# Altium footprint library Generic Footprint.PcbLib: 160 footprints (part 11 of 20)
Each footprint in its own frame and in the unit in brackets; x right, y up, seen from the top. Pads: shape width x height; smd on the part's side, far side on the other; paste and mask are expansions set on the pad; w line width, h text height; cw(c..) or ccw(c..) is an arc to the next point about the centre after c.
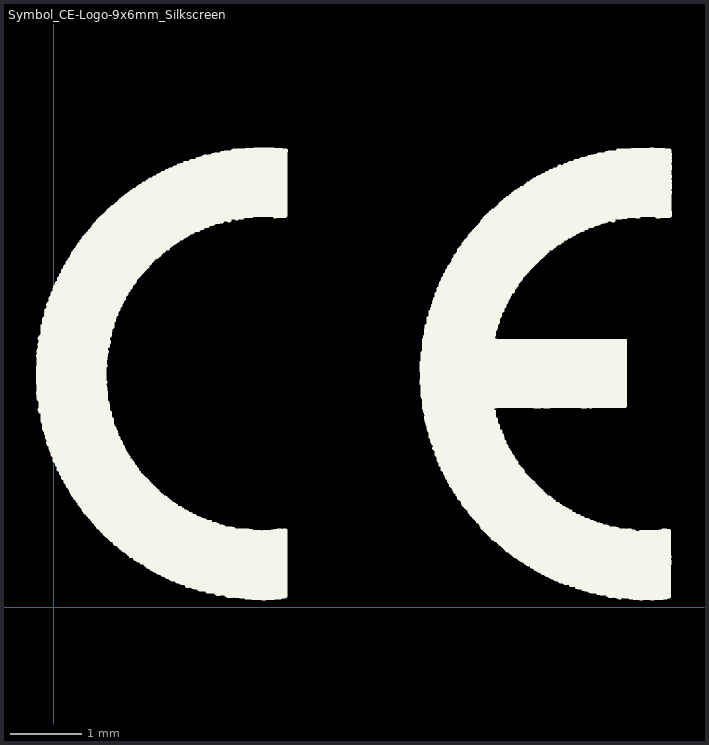
[diagram p10: the footprint, top view; thin cyan lines are the x and y axes]

## Symbol_CE-Logo-9x6mm_Silkscreen [mil]
pads (3108):
  round 2.36 on Top Overlay: 1(-8.64,118.11) 1(-8.64,123.42) 1(-8.64,123.77) 1(-8.64,124.13) 1(-8.64,124.49) 1(-8.64,124.84) 1(-8.64,125.19) 1(-8.64,125.55) 1(-8.64,126.61) 1(-8.64,126.96) 1(-8.64,127.32) 1(-8.64,127.67) 1(-8.64,128.03) 1(-8.64,128.38) 1(-8.64,128.74) 1(-8.64,129.09) 1(-8.64,129.44) 1(-8.64,129.8) 1(-8.64,130.15) 1(-8.64,130.51) 1(-8.64,130.86) 1(-8.64,131.22) 1(-8.64,131.57) 1(-8.64,131.93) 1(-8.64,132.28) 1(-8.64,138.66) 1(-8.29,115.27) 1(-8.29,115.63) 1(-8.29,115.98) 1(-8.29,116.33) 1(-8.29,116.69) 1(-8.29,118.46) 1(-8.29,118.82) 1(-8.29,119.17) 1(-8.29,119.52) 1(-8.29,119.88) 1(-8.29,120.23) 1(-8.29,120.59) 1(-8.29,120.94) 1(-8.29,121.3) 1(-8.29,121.65) 1(-8.29,122) 1(-8.29,122.36) 1(-8.29,122.71) 1(-8.29,123.07) 1(-8.29,125.9) 1(-8.29,126.26) 1(-8.29,132.63) 1(-8.29,132.99) 1(-8.29,133.34) 1(-8.29,133.7) 1(-8.29,134.05) 1(-8.29,134.41) 1(-8.29,134.76) 1(-8.29,135.11) 1(-8.29,135.47) 1(-8.29,135.82) 1(-8.29,136.18) 1(-8.29,136.53) 1(-8.29,136.88) 1(-8.29,137.24) 1(-8.29,137.6) 1(-8.29,137.95) 1(-8.29,138.3) 1(-8.29,140.78) 1(-8.29,141.14) 1(-7.94,114.56) 1(-7.94,114.92) 1(-7.94,117.04) 1(-7.94,117.4) 1(-7.94,117.75) 1(-7.94,139.01) 1(-7.94,139.37) 1(-7.94,139.72) 1(-7.94,140.07) 1(-7.94,140.43) 1(-7.94,141.49) 1(-7.94,141.85) 1(-7.94,142.2) 1(-7.58,108.89) 1(-7.58,142.55) 1(-7.58,144.33) 1(-7.58,144.68) 1(-7.58,145.04) 1(-7.58,148.22) 1(-7.23,107.83) 1(-7.23,108.18) 1(-7.23,108.54) 1(-7.23,109.96) 1(-7.23,110.31) 1(-7.23,110.66) 1(-7.23,111.02) 1(-7.23,111.37) 1(-7.23,111.73) 1(-7.23,112.08) 1(-7.23,112.44) 1(-7.23,112.79) 1(-7.23,113.15) 1(-7.23,113.5) 1(-7.23,113.85) 1(-7.23,114.21) 1(-7.23,142.91) 1(-7.23,143.26) 1(-7.23,143.62) 1(-7.23,143.97) 1(-7.23,145.39) 1(-7.23,145.74) 1(-7.23,146.1) 1(-7.23,146.45) 1(-7.23,146.81) 1(-6.87,109.25) 1(-6.87,109.6) 1(-6.87,147.16) 1(-6.87,147.52) 1(-6.87,147.87) 1(-6.87,148.58) 1(-6.87,148.93) 1(-6.87,149.29) 1(-6.17,102.87) 1(-6.17,103.22) 1(-6.17,103.58) 1(-6.17,103.93) 1(-6.17,104.29) 1(-6.17,104.64) 1(-6.17,104.99) 1(-6.17,105.35) 1(-6.17,105.71) 1(-6.17,106.06) 1(-6.17,106.41) 1(-6.17,106.77) 1(-6.17,107.48) 1(-6.17,149.64) 1(-6.17,149.99) 1(-6.17,150.35) 1(-6.17,150.71) 1(-6.17,151.06) 1(-6.17,151.41) 1(-6.17,151.77) 1(-6.17,152.12) 1(-6.17,152.48) 1(-6.17,152.83) 1(-6.17,153.18) 1(-6.17,153.54) 1(-6.17,154.96) 1(-5.81,102.16) 1(-5.81,102.52) 1(-5.81,107.12) 1(-5.81,153.89) 1(-5.81,154.25) 1(-5.81,154.6) 1(-5.1,98.26) 1(-5.1,98.97) 1(-5.1,99.33) 1(-5.1,99.68) 1(-5.1,100.04) 1(-5.1,100.39) 1(-5.1,100.74) 1(-5.1,101.1) 1(-5.1,101.45) 1(-5.1,101.81) 1(-5.1,155.31) 1(-5.1,155.66) 1(-5.1,156.02) 1(-5.1,156.37) 1(-5.1,156.73) 1(-5.1,157.08) 1(-5.1,157.44) 1(-5.1,157.79) 1(-5.1,158.15) 1(-5.1,158.85) 1(-4.75,97.55) 1(-4.75,97.91) 1(-4.75,98.62) 1(-4.75,158.5) 1(-4.75,159.21) 1(-4.39,159.56) 1(-4.04,95.78) 1(-4.04,96.14) 1(-4.04,96.49) 1(-4.04,97.2) 1(-4.04,161.33) 1(-4.04,161.69) 1(-4.04,162.04) 1(-4.04,163.46) 1(-3.68,93.66) 1(-3.68,94.01) 1(-3.68,94.37) 1(-3.68,94.72) 1(-3.68,95.07) 1(-3.68,95.43) 1(-3.68,96.85) 1(-3.68,159.92) 1(-3.68,160.27) 1(-3.68,160.63) 1(-3.68,160.98) 1(-3.68,162.4) 1(-3.68,162.75) 1(-3.68,163.11) 1(-3.33,92.95) 1(-3.33,93.3) 1(-3.33,163.82) 1(-3.33,164.17) 1(-2.98,90.47) 1(-2.98,166.65) 1(-2.62,89.76) 1(-2.62,90.11) 1(-2.62,90.82) 1(-2.62,91.18) 1(-2.62,91.53) 1(-2.62,91.88) 1(-2.62,92.24) 1(-2.62,92.6) 1(-2.62,164.52) 1(-2.62,164.88) 1(-2.62,165.23) 1(-2.62,165.59) 1(-2.62,165.94) 1(-2.62,166.3) 1(-2.62,167.36) 1(-2.27,89.41) 1(-2.27,167) 1(-1.56,87.28) 1(-1.56,87.63) 1(-1.56,87.99) 1(-1.56,88.34) 1(-1.56,88.7) 1(-1.56,89.05) 1(-1.56,167.71) 1(-1.56,168.07) 1(-1.56,168.42) 1(-1.56,168.77) 1(-1.56,169.13) 1(-1.56,169.49) 1(-1.56,169.84) 1(-1.56,170.19) 1(-1.2,86.22) 1(-1.2,86.57) 1(-1.2,86.93) 1(-1.2,170.55) 1(-1.2,170.9) 1(-0.85,85.86) 1(-0.5,84.09) 1(-0.5,84.8) 1(-0.5,85.51) 1(-0.5,171.26) 1(-0.5,171.61) 1(-0.5,172.32) 1(-0.5,173.03) 1(-0.14,84.44) 1(-0.14,85.15) 1(-0.14,171.96) 1(-0.14,172.67) 1(0.21,83.74) 1(0.57,80.9) 1(0.57,81.26) 1(0.57,81.61) 1(0.57,81.96) 1(0.57,82.32) 1(0.57,82.67) 1(0.57,83.03) 1(0.57,83.38) 1(0.57,173.38) 1(0.57,173.74) 1(0.57,174.09) 1(0.57,174.44) 1(0.57,174.8) 1(0.57,175.15) 1(0.57,175.51) 1(0.92,80.55) 1(0.92,175.86) 1(0.92,176.57) 1(1.28,80.19) 1(1.28,176.22) 1(1.63,176.93) 1(1.63,177.99) 1(1.99,78.42) 1(1.99,78.77) 1(1.99,79.13) 1(1.99,79.49) 1(1.99,79.84) 1(1.99,177.28) 1(1.99,177.63) 1(1.99,178.34) 1(1.99,178.7) 1(2.34,78.07) 1(2.69,75.94) 1(2.69,179.05) 1(3.05,76.3) 1(3.05,76.65) 1(3.05,77) 1(3.05,77.36) 1(3.05,77.71) 1(3.05,179.41) 1(3.05,179.76) 1(3.05,180.11) 1(3.05,180.47) 1(3.05,180.82) 1(3.05,181.18) 1(3.76,75.59) 1(4.11,73.82) 1(4.11,74.17) 1(4.11,74.52) 1(4.11,74.88) 1(4.11,75.23) 1(4.11,181.53) 1(4.11,181.88) 1(4.11,182.24) 1(4.11,182.6) 1(4.11,182.95) 1(4.47,73.46) 1(4.47,183.3) 1(5.17,71.33) 1(5.17,71.69) 1(5.17,72.04) 1(5.17,72.4) 1(5.17,72.75) 1(5.17,73.11) 1(5.17,183.66) 1(5.17,184.01) 1(5.17,184.37) 1(5.17,184.72) 1(5.17,185.07) 1(5.17,185.43) 1(5.53,185.78) 1(5.88,70.98) 1(6.24,70.63) 1(6.24,186.14) 1(6.24,186.49) 1(6.24,187.2) 1(6.59,69.21) 1(6.59,69.56) 1(6.59,69.92) 1(6.59,70.27) 1(6.59,186.85) 1(6.59,187.55) 1(6.59,187.91) 1(6.94,68.85) 1(7.66,67.44) 1(7.66,67.79) 1(7.66,68.15) 1(7.66,68.5) 1(7.66,188.26) 1(7.66,188.62) 1(7.66,188.97) 1(7.66,189.33) 1(7.66,189.68) 1(7.66,190.04) 1(8.01,66.73) 1(8.01,67.08) 1(8.36,190.39) 1(8.72,66.02) 1(8.72,66.37) 1(8.72,190.74) 1(8.72,191.1) 1(8.72,191.45) 1(9.07,65.66) 1(9.78,63.89) 1(9.78,64.25) 1(9.78,64.6) 1(9.78,64.96) 1(9.78,65.31) 1(9.78,191.81) 1(9.78,192.16) 1(9.78,192.52) 1(10.13,63.18) 1(10.13,63.54) 1(10.13,192.87) 1(10.13,193.22) 1(10.13,193.58) 1(10.84,61.77) 1(10.84,62.12) 1(10.84,62.48) 1(10.84,62.83) 1(10.84,193.93) 1(10.84,194.29) 1(10.84,194.64) 1(10.84,194.99) 1(10.84,195.35) 1(11.2,61.41) 1(11.2,195.71) 1(11.55,61.06) 1(11.55,196.06) 1(11.91,60.35) 1(11.91,60.71) 1(11.91,196.06) 1(12.26,59.99) 1(12.26,196.06) 1(12.26,196.41) 1(12.26,196.77) 1(12.26,197.12) 1(12.97,197.48) 1(13.32,58.58) 1(13.32,58.93) 1(13.32,59.29) 1(13.32,59.64) 1(13.32,197.83) 1(13.32,198.18) 1(13.32,198.54) 1(13.68,198.89) 1(13.68,199.25) 1(14.39,56.81) 1(14.39,57.16) 1(14.39,57.52) 1(14.39,57.87) 1(14.39,58.22) 1(14.39,199.6) 1(14.39,199.96) 1(14.39,200.31) 1(14.74,56.45) 1(15.45,55.74) 1(15.45,56.1) 1(15.45,200.66) 1(15.45,201.02) 1(15.45,201.73) 1(15.8,55.39) 1(15.8,201.37) 1(16.51,53.97) 1(16.51,54.33) 1(16.51,54.68) 1(16.51,55.04) 1(16.51,202.08) 1(16.51,202.44) 1(16.51,202.79) 1(16.51,203.15) 1(16.87,53.26) 1(16.87,53.62) 1(16.87,203.5) 1(16.87,203.85) 1(17.58,52.2) 1(17.58,52.91) 1(17.58,204.21) 1(17.93,52.55) 1(17.93,204.56) 1(17.93,204.92) 1(18.28,51.85) 1(18.99,50.78) 1(18.99,51.14) 1(18.99,51.49) 1(18.99,205.27) 1(18.99,205.63) 1(18.99,205.98) 1(19.35,206.33) 1(20.05,49.72) 1(20.05,50.07) 1(20.05,50.43) 1(20.05,206.69) 1(20.05,207.04) 1(20.05,207.4) 1(21.12,48.66) 1(21.12,49.01) 1(21.12,49.37) 1(21.12,207.75) 1(21.12,208.11) 1(21.12,208.46) 1(21.83,48.3) 1(22.18,47.24) 1(22.18,47.6) 1(22.18,47.95) 1(22.18,208.82) 1(22.18,209.17) 1(22.18,209.52) 1(22.18,209.88) 1(22.54,210.23) 1(22.54,210.59) 1(22.89,47.24) 1(23.24,46.18) 1(23.24,47.24) 1(23.24,210.94) 1(23.6,45.47) 1(23.6,45.82) 1(23.6,46.53) 1(23.6,46.88) 1(23.6,211.3) 1(23.6,211.65) 1(23.95,45.11) 1(23.95,212) 1(24.66,44.05) 1(24.66,44.41) 1(24.66,44.76) 1(24.66,212.36) 1(24.66,212.71) 1(24.66,213.07) 1(25.37,43.7) 1(25.72,213.42) 1(25.72,213.77) 1(25.72,214.13) 1(26.08,42.99) 1(26.08,43.34) 1(26.43,42.63) 1(26.79,41.93) 1(26.79,42.28) 1(26.79,214.49) 1(26.79,214.84) 1(26.79,215.19) 1(27.5,41.57) 1(27.85,41.22) 1(27.85,122.36) 1(27.85,122.71) 1(27.85,123.07) 1(27.85,123.42) 1(27.85,124.84) 1(27.85,125.19) 1(27.85,125.55) 1(27.85,125.9) 1(27.85,126.26) 1(27.85,126.61) 1(27.85,126.96) 1(27.85,127.32) 1(27.85,127.67) 1(27.85,128.03) 1(27.85,128.38) 1(27.85,128.74) 1(27.85,129.09) 1(27.85,129.44) 1(27.85,129.8) 1(27.85,130.15) 1(27.85,130.51) 1(27.85,130.86) 1(27.85,131.22) 1(27.85,131.57) 1(27.85,131.93) 1(27.85,132.28) 1(27.85,133.7) 1(27.85,134.05) 1(27.85,134.41) 1(27.85,134.76) 1(27.85,215.55) 1(27.85,215.9) 1(28.21,40.51) 1(28.21,40.86) 1(28.21,120.94) 1(28.21,121.3) 1(28.21,121.65) 1(28.21,122) 1(28.21,123.77) 1(28.21,124.49) 1(28.21,132.63) 1(28.21,135.11) 1(28.21,135.47) 1(28.21,135.82) 1(28.21,136.18) 1(28.21,136.53) 1(28.21,216.26) 1(28.56,117.4) 1(28.56,117.75) 1(28.56,118.11) 1(28.56,118.82) 1(28.56,119.17) 1(28.56,119.52) 1(28.56,119.88) 1(28.56,120.23) 1(28.56,120.59) 1(28.56,124.13) 1(28.56,132.99) 1(28.56,133.34) 1(28.56,136.88) 1(28.56,137.24) 1(28.56,137.6) 1(28.56,137.95) 1(28.56,138.3) 1(28.56,138.66) 1(28.56,139.37) 1(28.56,139.72) 1(28.56,140.07) 1(28.56,140.43) 1(28.56,141.85) 1(28.56,143.62) 1(28.91,113.15) 1(28.91,113.5) 1(28.91,113.85) 1(28.91,114.21) 1(28.91,114.56) 1(28.91,114.92) 1(28.91,115.27) 1(28.91,115.63) 1(28.91,115.98) 1(28.91,116.33) 1(28.91,116.69) 1(28.91,117.04) 1(28.91,118.46) 1(28.91,139.01) 1(28.91,141.14) 1(28.91,141.49) 1(28.91,142.2) 1(28.91,142.55) 1(28.91,142.91) 1(28.91,143.26) 1(28.91,216.61) 1(29.27,39.44) 1(29.27,39.8) 1(29.27,40.15) 1(29.27,140.78) 1(29.27,143.97) 1(29.27,216.96) 1(29.27,217.32) 1(29.62,110.66) 1(29.62,111.73) 1(29.62,112.08) 1(29.62,112.44) 1(29.62,112.79) 1(29.62,143.97) 1(29.62,144.33) 1(29.62,144.68) 1(29.62,145.04) 1(29.62,217.67) 1(29.98,107.48) 1(29.98,107.83) 1(29.98,108.18) 1(29.98,108.54) 1(29.98,108.89) 1(29.98,109.25) 1(29.98,109.6) 1(29.98,109.96) 1(29.98,110.31) 1(29.98,111.02) 1(29.98,111.37) 1(29.98,143.97) 1(29.98,145.39) 1(29.98,146.81) 1(29.98,147.16) 1(29.98,147.52) 1(29.98,147.87) 1(29.98,148.22) 1(29.98,148.58) 1(29.98,148.93) 1(29.98,149.29) 1(30.33,38.74) 1(30.33,39.09) 1(30.33,145.74) 1(30.33,146.1) 1(30.33,146.45) 1(30.33,149.64) 1(30.33,218.03) 1(30.33,218.38) 1(30.33,218.74) 1(30.69,38.38) 1(30.69,106.77) 1(30.69,150.71) 1(31.04,38.03) 1(31.04,103.93) 1(31.04,104.29) 1(31.04,104.64) 1(31.04,104.99) 1(31.04,105.35) 1(31.04,105.71) 1(31.04,106.06) 1(31.04,106.41) 1(31.04,107.12) 1(31.04,149.99) 1(31.04,150.35) 1(31.04,151.06) 1(31.04,151.41) 1(31.04,151.77) 1(31.04,152.12) 1(31.04,152.48) 1(31.04,153.89) 1(31.39,37.67) 1(31.39,152.83) 1(31.39,153.18) 1(31.39,153.54) 1(31.39,219.09) 1(31.39,219.44) 1(31.75,37.32) 1(31.75,102.87) 1(31.75,103.22) 1(31.75,154.25) 1(31.75,219.8) 1(32.1,36.96) 1(32.1,99.68) 1(32.1,100.39) 1(32.1,100.74) 1(32.1,101.1) 1(32.1,101.45) 1(32.1,101.81) 1(32.1,102.16) 1(32.1,102.52) 1(32.1,103.58) 1(32.1,154.96) 1(32.1,156.02) 1(32.1,156.37) 1(32.1,156.73) 1(32.46,99.33) 1(32.46,100.04) 1(32.46,154.6) 1(32.46,155.31) 1(32.46,155.66) 1(32.46,157.08) 1(32.46,157.44) 1(32.46,220.15) 1(32.46,220.51) 1(32.81,157.79) 1(33.17,97.55) 1(33.17,98.62) 1(33.17,98.97) 1(33.17,158.15) 1(33.17,158.5) 1(33.17,158.85) 1(33.17,159.21) 1(33.17,159.92) 1(33.17,160.63) 1(33.17,220.86) 1(33.52,35.9) 1(33.52,97.2) 1(33.52,97.91) 1(33.52,98.26) 1(33.52,159.56) 1(33.52,160.27) 1(33.52,160.98) 1(33.88,35.19) 1(33.88,35.55) 1(33.88,36.26) 1(33.88,36.61) 1(34.23,34.84) 1(34.23,94.01) 1(34.23,94.72) 1(34.23,95.78) 1(34.23,96.14) 1(34.23,96.49) 1(34.23,96.85) 1(34.23,161.69) 1(34.23,162.75) 1(34.58,93.66) 1(34.58,94.37) 1(34.58,95.07) 1(34.58,95.43) 1(34.58,161.33) 1(34.58,162.04) 1(34.58,162.4) 1(34.58,163.11) 1(34.58,221.22) 1(34.58,221.93) 1(34.94,163.46) 1(34.94,221.57) 1(34.94,222.28) 1(35.29,163.82) 1(35.65,91.53) 1(35.65,91.88) 1(35.65,92.24) 1(35.65,92.6) 1(35.65,92.95) 1(35.65,93.3) 1(35.65,164.17) 1(35.65,164.52) 1(35.65,164.88) 1(35.65,165.23) 1(36,33.77) 1(36,34.13) 1(36,34.49) 1(36,165.59) 1(36,222.63) 1(36,222.99) 1(36,223.34) 1(36.36,165.94) 1(36.71,89.41) 1(36.71,89.76) 1(36.71,90.11) 1(36.71,90.82) 1(36.71,91.18) 1(36.71,166.3) 1(36.71,166.65) 1(36.71,167) 1(36.71,167.36) 1(37.06,32.71) 1(37.06,33.07) 1(37.06,33.42) 1(37.06,89.05) 1(37.06,90.47) 1(37.06,167.71) 1(37.06,223.7) 1(37.06,224.05) 1(37.06,224.41) 1(37.42,168.07) 1(37.77,32.36) 1(37.77,88.7) 1(37.77,168.42) 1(37.77,168.77) 1(37.77,169.13) 1(38.13,32) 1(38.13,86.93) 1(38.13,87.28) 1(38.13,87.63) 1(38.13,87.99) 1(38.13,88.34) 1(38.13,169.49) 1(38.13,169.84) 1(38.13,224.76) 1(38.48,31.65) 1(38.48,225.11) 1(38.48,225.47) 1(38.83,31.3) 1(38.83,85.15) 1(38.83,85.86) 1(38.83,86.22) 1(38.83,86.57) 1(38.83,170.19) 1(38.83,170.55) 1(38.83,170.9) 1(38.83,171.26) 1(38.83,171.61) 1(39.19,31.3) 1(39.19,84.8) 1(39.19,85.51) 1(39.19,171.96) 1(39.19,172.32) 1(39.19,225.82) 1(39.55,31.3) 1(39.55,226.18) 1(39.9,31.3) 1(39.9,83.74) 1(39.9,84.44) 1(39.9,172.67) 1(39.9,226.53) 1(40.25,31.3) 1(40.25,83.38) 1(40.25,84.09) 1(40.25,173.03) 1(40.25,173.38) 1(40.25,173.74) 1(40.25,174.09) 1(40.25,174.44) 1(40.25,226.88) 1(40.61,30.23) 1(40.61,30.59) 1(40.61,30.94) 1(40.61,226.88) 1(40.96,30.23) 1(40.96,83.03) 1(41.32,30.23) 1(41.32,81.26) 1(41.32,81.61) 1(41.32,81.96) 1(41.32,82.32) 1(41.32,82.67) 1(41.32,174.8) 1(41.32,175.15) 1(41.32,175.51) 1(41.67,29.17) 1(41.67,29.52) 1(41.67,29.88) 1(41.67,175.86) 1(41.67,226.88) 1(41.67,227.24) 1(41.67,227.6) 1(41.67,227.95) 1(42.38,80.55) 1(42.38,80.9) 1(42.38,176.22) 1(42.38,176.57) 1(42.73,28.11) 1(42.73,28.46) 1(42.73,28.82) 1(42.73,80.19) 1(42.73,176.93) 1(42.73,177.28) 1(42.73,177.63) 1(42.73,177.99) 1(42.73,228.3) 1(42.73,228.66) 1(43.09,79.84) 1(43.09,229.01) 1(43.44,78.42) 1(43.44,79.13) 1(43.44,79.49) 1(43.44,178.34) 1(43.8,77.71) 1(43.8,78.07) 1(43.8,78.77) 1(43.8,178.7) 1(43.8,179.05) 1(43.8,179.41) 1(44.15,179.41) 1(44.15,229.37) 1(44.15,229.72) 1(44.5,179.41) 1(44.5,179.76) 1(44.5,180.47) 1(44.5,181.18) 1(44.5,230.07) 1(44.86,27.04) 1(44.86,27.75) 1(44.86,76.65) 1(44.86,77) 1(44.86,77.36) 1(44.86,180.11) 1(44.86,180.82) 1(44.86,181.53) 1(45.21,26.69) 1(45.21,27.4) 1(45.57,76.3) 1(45.92,74.52) 1(45.92,74.88) 1(45.92,75.23) 1(45.92,75.59) 1(45.92,75.94) 1(45.92,181.88) 1(45.92,182.24) 1(46.28,25.98) 1(46.28,26.33) 1(46.28,74.17) 1(46.28,182.6) 1(46.28,230.43) 1(46.28,230.78) 1(46.28,231.14) 1(46.63,74.17) 1(46.63,231.49) 1(46.99,25.63) 1(46.99,73.46) 1(46.99,73.82) 1(46.99,74.17) 1(46.99,182.95) 1(46.99,183.3) 1(46.99,183.66) 1(46.99,231.49) 1(47.34,73.11) 1(47.34,231.49) 1(47.34,231.85) 1(47.69,184.01) 1(47.69,232.2) 1(48.05,72.75) 1(48.05,184.37) 1(48.4,24.92) 1(48.4,25.27) 1(48.4,72.04) 1(48.4,72.4) 1(48.4,184.72) 1(48.76,24.56) 1(48.76,185.07) 1(49.11,71.69) 1(49.11,185.43) 1(49.47,70.98) 1(49.47,71.33) 1(49.47,185.78) 1(49.47,186.14) 1(49.47,233.26) 1(49.82,232.55) 1(49.82,232.91) 1(49.82,233.62) 1(50.17,186.49) 1(50.53,69.92) 1(50.53,70.27) 1(50.53,70.63) 1(50.53,186.85) 1(50.53,187.2) 1(50.88,23.5) 1(50.88,23.85) 1(50.88,24.21) 1(51.24,187.55) 1(51.59,68.5) 1(51.59,68.85) 1(51.59,69.21) 1(51.59,69.56) 1(51.59,187.91) 1(51.59,188.26) 1(51.59,188.62) 1(51.59,188.97) 1(51.59,189.33) 1(51.94,22.44) 1(51.94,22.79) 1(51.94,23.15) 1(51.94,189.68) 1(51.94,233.97) 1(51.94,234.33) 1(51.94,234.68) 1(52.3,189.68) 1(52.66,22.08) 1(52.66,67.44) 1(52.66,68.15) 1(52.66,190.04) 1(52.66,190.39) 1(53.01,67.79) 1(53.01,189.68) 1(53.01,190.74) 1(53.01,235.04) 1(53.01,235.39) 1(53.36,22.08) 1(53.36,190.74) 1(53.36,235.74) 1(53.72,66.73) 1(53.72,67.08) 1(53.72,190.74) 1(53.72,191.45) 1(54.07,21.02) 1(54.07,21.37) 1(54.07,22.08) 1(54.07,66.37) 1(54.07,191.1) 1(54.07,191.81) 1(54.43,21.73) 1(54.78,66.02) 1(54.78,192.52) 1(55.13,65.66) 1(55.13,192.16) 1(55.13,192.87) 1(55.49,20.31) 1(55.49,20.66) 1(55.49,65.31) 1(55.49,236.1) 1(55.49,236.45) 1(55.49,236.81) 1(55.84,64.96) 1(56.2,64.25) 1(56.2,64.6) 1(56.55,19.96) 1(56.91,193.22) 1(57.26,63.18) 1(57.26,63.54) 1(57.26,63.89) 1(57.26,193.58) 1(57.26,193.93) 1(57.61,19.25) 1(57.61,19.6) 1(57.61,62.83) 1(57.61,237.16) 1(57.61,237.52) 1(57.61,237.87) 1(58.32,18.89) 1(58.32,61.77) 1(58.32,62.12) 1(58.32,62.48) 1(58.32,194.29) 1(58.32,194.64) 1(58.32,194.99) 1(58.32,238.22) 1(58.68,195.35) 1(59.39,61.06) 1(59.39,195.71) 1(59.39,196.06) 1(59.39,238.22) 1(59.74,18.54) 1(59.74,60.71) 1(59.74,61.41) 1(59.74,238.22) 1(59.74,238.58) 1(59.74,238.93) 1(60.1,18.18) 1(60.1,239.29) 1(60.45,17.83) 1(60.45,196.41) 1(60.45,197.12) 1(60.8,196.77) 1(60.8,197.48) 1(61.51,60.35) 1(61.87,17.48) 1(61.87,59.64) 1(61.87,59.99) 1(62.22,17.12) 1(62.22,239.64) 1(62.22,239.99) 1(62.22,240.35) 1(62.58,16.77) 1(62.58,59.29) 1(62.93,58.58) 1(62.93,58.93) 1(62.93,197.83) 1(62.93,198.18) 1(62.93,198.54) 1(63.28,58.22) 1(63.64,58.22) 1(63.64,198.89) 1(63.99,16.41) 1(63.99,57.52) 1(63.99,58.22) 1(63.99,199.25) 1(63.99,199.6) 1(64.35,16.06) 1(64.35,57.16) 1(64.35,57.87) 1(64.35,240.71) 1(64.35,241.06) 1(64.35,241.41) 1(64.7,15.71) 1(65.05,199.96) 1(65.05,200.31) 1(65.41,15.35) 1(65.41,200.66) 1(65.77,15.35) 1(65.77,201.02) 1(66.12,15.35) 1(66.12,56.81) 1(66.12,201.02) 1(66.47,56.45) 1(66.47,201.02) 1(66.47,241.77) 1(66.47,242.12) 1(66.83,56.1) 1(67.18,201.37) 1(67.18,242.48) 1(67.54,55.04) 1(67.54,55.39) 1(67.54,55.74) 1(67.54,201.73) 1(67.54,202.08) 1(67.89,14.64) 1(67.89,14.99) 1(67.89,202.08) 1(68.24,14.29) 1(68.24,202.08) 1(68.6,202.44) 1(68.6,202.79) 1(68.95,54.68) 1(68.95,203.15) 1(68.95,242.83) 1(68.95,243.18) 1(68.95,243.54) 1(69.31,54.68) 1(69.66,53.97) 1(69.66,54.33) 1(69.66,54.68) 1(70.02,13.58) 1(70.02,13.93) 1(70.37,243.89) 1(70.72,52.91) 1(70.72,203.5) 1(71.08,13.22) 1(71.08,52.55) 1(71.08,53.26) 1(71.08,53.62) 1(71.08,203.85) 1(71.08,204.21) 1(71.08,243.89) 1(71.43,243.89) 1(72.14,204.56) 1(72.14,244.25) 1(72.5,52.55) 1(72.5,244.6) 1(72.5,244.96) 1(72.85,52.55) 1(72.85,244.96) 1(73.21,12.87) 1(73.21,51.49) 1(73.21,51.85) 1(73.21,204.92) 1(73.21,205.27) 1(73.21,244.96) 1(73.56,11.81) 1(73.56,12.16) 1(73.56,12.52) 1(73.56,52.2) 1(73.91,205.63) 1(74.27,11.81) 1(74.27,205.98) 1(74.27,206.33) 1(74.62,206.69) 1(74.98,206.69) 1(75.69,11.81) 1(75.69,50.43) 1(75.69,50.78) 1(75.69,51.14) 1(75.69,245.31) 1(75.69,245.66) 1(76.04,11.81) 1(76.04,206.69) 1(76.04,246.02) 1(76.39,11.81) 1(76.39,207.4) 1(76.39,246.02) 1(76.75,207.04) 1(76.75,207.75) 1(76.75,246.02) 1(77.1,11.1) 1(77.1,11.45) 1(77.81,49.37) 1(77.81,49.72) 1(77.81,50.07) 1(78.17,10.74) 1(79.23,246.37) 1(79.23,246.73) 1(79.58,49.01) 1(79.58,247.08) 1(79.94,208.11) 1(79.94,208.46) 1(80.29,10.04) 1(80.29,10.39) 1(80.29,208.82) 1(80.65,48.66) 1(81,9.68) 1(81,48.3) 1(81.36,9.68) 1(81.36,247.44) 1(81.71,9.68) 1(81.71,247.44) 1(82.06,209.17) 1(82.06,209.52) 1(82.42,47.95) 1(82.42,209.88) 1(82.42,247.44) 1(82.42,247.79) 1(83.48,46.88) 1(83.48,47.24) 1(83.48,47.6) 1(83.48,248.15) 1(83.48,248.5) 1(83.83,248.5) 1(84.19,210.23) 1(84.55,46.88) 1(84.55,210.23) 1(84.55,210.59) 1(84.55,210.94) 1(84.9,8.62) 1(84.9,8.97) 1(84.9,9.33) 1(84.9,46.88) 1(84.9,210.23) 1(84.9,211.3) 1(85.25,211.3) 1(85.61,8.62) 1(85.61,248.5) 1(85.96,8.62) 1(85.96,46.88) 1(85.96,248.5) 1(86.32,46.53) 1(86.32,46.88) 1(86.67,45.82) 1(86.67,46.18) 1(87.02,211.3) 1(87.02,248.5) 1(87.38,248.85) 1(87.73,249.21) 1(88.09,211.65) 1(88.09,212) 1(88.44,212.36) 1(88.8,45.82) 1(88.8,212.36) 1(89.15,45.47) 1(89.15,45.82) 1(89.15,212.36) 1(89.15,249.56) 1(89.5,7.91) 1(89.5,8.26) 1(89.5,212.36) 1(90.21,212.36) 1(90.57,7.2) 1(90.57,7.55) 1(90.57,44.76) 1(90.57,45.11) 1(90.57,212.36) 1(90.92,7.2) 1(90.92,212.36) 1(91.99,212.71) 1(92.34,212.71) 1(92.69,44.41) 1(92.69,212.71) 1(92.69,213.07) 1(92.69,213.42) 1(92.69,250.27) 1(93.05,249.92) 1(93.76,43.7) 1(93.76,44.05) 1(94.47,250.63) 1(95.17,6.85) 1(95.17,7.2) 1(96.24,6.14) 1(96.24,6.49) 1(96.24,213.77) 1(96.59,6.14) 1(96.59,213.42) 1(96.59,213.77) 1(96.94,213.42) 1(96.94,213.77) 1(96.94,214.13) 1(97.3,214.49) 1(98.01,6.14) 1(98.01,43.34) 1(98.36,6.14) 1(98.72,250.98) 1(98.72,251.33) 1(99.07,42.99) 1(99.43,42.63) 1(99.43,251.69) 1(99.78,6.14) 1(99.78,42.28) 1(99.78,251.69) 1(100.13,42.28) 1(100.49,214.84) 1(100.84,6.14) 1(100.84,42.28) 1(100.84,214.49) 1(100.84,214.84) 1(101.2,214.49) 1(101.2,214.84) 1(101.2,251.69) 1(101.55,6.14) 1(101.55,42.28) 1(101.91,6.14) 1(102.26,6.14) 1(103.32,5.78) 1(103.32,42.28) 1(103.32,214.84) 1(103.68,42.28) 1(104.03,214.84) 1(104.03,215.19) 1(104.03,215.55) 1(104.39,42.28) 1(105.8,42.28) 1(106.16,5.43) 1(106.16,252.04) 1(106.87,41.93) 1(106.87,42.28) 1(107.22,215.9) 1(107.58,215.9) 1(107.58,252.04) 1(108.28,41.93) 1(108.64,41.93) 1(108.64,215.9) 1(108.99,215.9) 1(108.99,252.04) 1(109.35,215.9) 1(109.7,5.07) 1(109.7,41.57) 1(109.7,252.04) 1(110.05,41.22) 1(111.12,41.22) 1(111.12,252.04) 1(111.12,252.4) 1(112.18,41.22) 1(112.89,41.22) 1(114.31,41.22) 1(114.66,5.07) 1(115.02,5.07) 1(115.37,4.72) 1(115.72,4.72) 1(115.72,41.22) 1(116.08,4.72) 1(116.43,4.72) 1(118.91,41.22) 1(120.33,5.07) 1(120.33,41.22) 1(120.33,41.57) 1(120.69,5.07) 1(121.04,5.07) 1(121.04,252.4) 1(121.39,252.04) 1(122.1,41.93) 1(122.1,215.55) 1(122.1,215.9) 1(122.46,41.93) 1(122.46,215.55) 1(122.46,252.04) 1(122.81,215.9) 1(123.17,215.9) 1(123.52,252.04) 1(123.88,41.93) 1(123.88,42.28) 1(124.58,252.04) 1(124.94,5.43) 1(124.94,42.28) 1(125.65,252.04) 1(127.06,5.78) 1(127.06,42.28) 1(127.77,6.14) 1(127.77,6.49) 1(127.77,6.85) 1(127.77,7.2) 1(127.77,7.55) 1(127.77,7.91) 1(127.77,8.26) 1(127.77,8.62) 1(127.77,8.97) 1(127.77,9.33) 1(127.77,9.68) 1(127.77,10.04) 1(127.77,10.39) 1(127.77,10.74) 1(127.77,11.1) 1(127.77,11.45) 1(127.77,11.81) 1(127.77,12.16) 1(127.77,12.52) 1(127.77,12.87) 1(127.77,13.22) 1(127.77,13.58) 1(127.77,13.93) 1(127.77,14.29) 1(127.77,14.64) 1(127.77,14.99) 1(127.77,15.35) 1(127.77,15.71) 1(127.77,16.06) 1(127.77,16.41) 1(127.77,16.77) 1(127.77,17.12) 1(127.77,17.48) 1(127.77,17.83) 1(127.77,18.18) 1(127.77,18.54) 1(127.77,18.89) 1(127.77,19.25) 1(127.77,19.6) 1(127.77,19.96) 1(127.77,20.31) 1(127.77,20.66) 1(127.77,21.02) 1(127.77,21.37) 1(127.77,21.73) 1(127.77,22.08) 1(127.77,22.44) 1(127.77,22.79) 1(127.77,23.15) 1(127.77,23.5) 1(127.77,23.85) 1(127.77,24.21) 1(127.77,24.56) 1(127.77,24.92) 1(127.77,25.27) 1(127.77,25.63) 1(127.77,25.98) 1(127.77,26.33) 1(127.77,26.69) 1(127.77,27.04) 1(127.77,27.4) 1(127.77,27.75) 1(127.77,28.11) 1(127.77,28.46) 1(127.77,28.82) 1(127.77,29.17) 1(127.77,29.52) 1(127.77,29.88) 1(127.77,30.23) 1(127.77,30.59) 1(127.77,30.94) 1(127.77,31.3) 1(127.77,31.65) 1(127.77,32) 1(127.77,32.36) 1(127.77,32.71) 1(127.77,33.07) 1(127.77,33.42) 1(127.77,33.77) 1(127.77,34.13) 1(127.77,34.49) 1(127.77,34.84) 1(127.77,35.19) 1(127.77,35.55) 1(127.77,35.9) 1(127.77,36.26) 1(127.77,36.61) 1(127.77,36.96) 1(127.77,37.32) 1(127.77,37.67) 1(127.77,38.03) 1(127.77,38.38) 1(127.77,38.74) 1(127.77,39.09) 1(127.77,39.44) 1(127.77,39.8) 1(127.77,40.15) 1(127.77,40.51) 1(127.77,40.86) 1(127.77,41.22) 1(127.77,41.57) 1(127.77,41.93) 1(127.77,42.28) 1(127.77,215.9) 1(127.77,216.26) 1(127.77,216.61) 1(127.77,216.96) 1(127.77,217.32) 1(127.77,217.67) 1(127.77,218.03) 1(127.77,218.38) 1(127.77,218.74) 1(127.77,219.09) 1(127.77,219.44) 1(127.77,219.8) 1(127.77,220.15) 1(127.77,220.51) 1(127.77,220.86) 1(127.77,221.22) 1(127.77,221.57) 1(127.77,221.93) 1(127.77,222.28) 1(127.77,222.63) 1(127.77,222.99) 1(127.77,223.34) 1(127.77,223.7) 1(127.77,224.05) 1(127.77,224.41) 1(127.77,224.76) 1(127.77,225.11) 1(127.77,225.47) 1(127.77,225.82) 1(127.77,226.18) 1(127.77,226.53) 1(127.77,226.88) 1(127.77,227.24) 1(127.77,227.6) 1(127.77,227.95) 1(127.77,228.3) 1(127.77,228.66) 1(127.77,229.01) 1(127.77,229.37) 1(127.77,229.72) 1(127.77,230.07) 1(127.77,230.43) 1(127.77,230.78) 1(127.77,231.14) 1(127.77,231.49) 1(127.77,231.85) 1(127.77,232.2) 1(127.77,232.55) 1(127.77,232.91) 1(127.77,233.26) 1(127.77,233.62) 1(127.77,233.97) 1(127.77,234.33) 1(127.77,234.68) 1(127.77,235.04) 1(127.77,235.39) 1(127.77,235.74) 1(127.77,236.1) 1(127.77,236.45) 1(127.77,236.81) 1(127.77,237.16) 1(127.77,237.52) 1(127.77,237.87) 1(127.77,238.22) 1(127.77,238.58) 1(127.77,238.93) 1(127.77,239.29) 1(127.77,239.64) 1(127.77,239.99) 1(127.77,240.35) 1(127.77,240.71) 1(127.77,241.06) 1(127.77,241.41) 1(127.77,241.77) 1(127.77,242.12) 1(127.77,242.48) 1(127.77,242.83) 1(127.77,243.18) 1(127.77,243.54) 1(127.77,243.89) 1(127.77,244.25) 1(127.77,244.6) 1(127.77,244.96) 1(127.77,245.31) 1(127.77,245.66) 1(127.77,246.02) 1(127.77,246.37) 1(127.77,246.73) 1(127.77,247.08) 1(127.77,247.44) 1(127.77,247.79) 1(127.77,248.15) 1(127.77,248.5) 1(127.77,248.85) 1(127.77,249.21) 1(127.77,249.56) 1(127.77,249.92) 1(127.77,250.27) 1(127.77,250.63) 1(127.77,250.98) 1(127.77,251.33) 1(128.13,251.69) 1(202.89,123.42) 1(202.89,123.77) 1(202.89,124.13) 1(202.89,124.49) 1(202.89,124.84) 1(202.89,130.51) 1(202.89,130.86) 1(202.89,131.22) 1(202.89,131.93) 1(202.89,132.28) 1(202.89,132.63) 1(202.89,132.99) 1(202.89,133.34) 1(202.89,133.7) 1(202.89,134.05) 1(202.89,134.41) 1(202.89,134.76) 1(203.24,123.07) 1(203.24,125.19) 1(203.24,125.55) 1(203.24,125.9) 1(203.24,126.26) 1(203.24,126.61) 1(203.24,126.96) 1(203.24,127.32) 1(203.24,127.67) 1(203.24,128.03) 1(203.24,128.38) 1(203.24,128.74) 1(203.24,129.09) 1(203.24,129.44) 1(203.24,129.8) 1(203.24,130.15) 1(203.6,116.33) 1(203.6,116.69) 1(203.6,117.04) 1(203.6,117.4) 1(203.6,117.75) 1(203.6,118.11) 1(203.6,118.46) 1(203.6,118.82) 1(203.6,119.17) 1(203.6,119.52) 1(203.6,119.88) 1(203.6,120.23) 1(203.6,120.59) 1(203.6,120.94) 1(203.6,121.3) 1(203.6,121.65) 1(203.6,122) 1(203.6,122.36) 1(203.6,122.71) 1(203.6,131.57) 1(203.6,135.11) 1(203.6,135.47) 1(203.6,135.82) 1(203.6,136.18) 1(203.6,136.53) 1(203.6,136.88) 1(203.6,137.24) 1(203.6,137.6) 1(203.6,137.95) 1(203.6,138.3) 1(203.6,138.66) 1(203.6,139.01) 1(203.6,139.37) 1(203.6,139.72) 1(203.6,140.07) 1(203.95,115.63) 1(203.95,115.98) 1(204.31,109.96) 1(204.31,110.31) 1(204.31,111.73) 1(204.31,112.79) 1(204.31,113.5) 1(204.31,113.85) 1(204.31,114.21) 1(204.31,114.92) 1(204.31,115.27) 1(204.31,140.43) 1(204.31,141.14) 1(204.31,141.85) 1(204.31,142.2) 1(204.31,142.55) 1(204.31,142.91) 1(204.31,143.26) 1(204.31,143.62) 1(204.31,143.97) 1(204.31,144.33) 1(204.31,145.04) 1(204.31,146.45) 1(204.31,147.52) 1(204.66,108.89) 1(204.66,109.25) 1(204.66,109.6) 1(204.66,110.66) 1(204.66,111.02) 1(204.66,111.37) 1(204.66,112.08) 1(204.66,112.44) 1(204.66,113.15) 1(204.66,114.56) 1(204.66,140.78) 1(204.66,141.49) 1(204.66,144.68) 1(204.66,145.39) 1(204.66,145.74) 1(204.66,146.1) 1(204.66,146.81) 1(204.66,147.16) 1(204.66,147.87) 1(205.02,107.83) 1(205.02,108.18) 1(205.02,108.54) 1(205.02,148.22) 1(205.02,148.58) 1(205.02,148.93) 1(205.02,149.29) 1(205.37,104.29) 1(205.37,104.64) 1(205.37,106.77) 1(205.37,149.64) 1(205.37,149.99) 1(205.37,150.71) 1(205.37,152.12) 1(205.37,152.83) 1(205.72,102.87) 1(205.72,103.22) 1(205.72,103.58) 1(205.72,103.93) 1(205.72,104.99) 1(205.72,105.35) 1(205.72,105.71) 1(205.72,106.06) 1(205.72,106.41) 1(205.72,107.12) 1(205.72,107.48) 1(205.72,150.35) 1(205.72,151.06) 1(205.72,151.41) 1(205.72,151.77) 1(205.72,152.48) 1(205.72,153.18) 1(205.72,153.54) 1(205.72,154.96) 1(206.08,102.16) 1(206.08,102.52) 1(206.08,153.89) 1(206.08,154.25) 1(206.08,154.6) 1(206.43,100.74) 1(206.43,101.81) 1(206.79,98.62) 1(206.79,98.97) 1(206.79,99.33) 1(206.79,99.68) 1(206.79,100.04) 1(206.79,100.39) 1(206.79,101.1) 1(206.79,101.45) 1(206.79,155.31) 1(206.79,155.66) 1(206.79,156.02) 1(206.79,156.37) 1(206.79,156.73) 1(206.79,157.08) 1(206.79,157.44) 1(206.79,157.79) 1(206.79,158.15) 1(206.79,159.21) 1(207.14,97.55) 1(207.14,97.91) 1(207.14,98.26) 1(207.14,158.5) 1(207.14,158.85) 1(207.5,97.2) 1(207.5,159.56) 1(207.85,94.01) 1(207.85,94.72) 1(207.85,95.07) 1(207.85,95.43) 1(207.85,95.78) 1(207.85,96.14) 1(207.85,96.49) 1(207.85,96.85) 1(207.85,159.92) 1(207.85,160.27) 1(207.85,160.63) 1(207.85,160.98) 1(207.85,161.33) 1(207.85,161.69) 1(207.85,162.4) 1(207.85,162.75) 1(208.21,94.37) 1(208.21,162.04) 1(208.91,91.53) 1(208.91,92.6) 1(208.91,92.95) 1(208.91,93.3) 1(208.91,93.66) 1(208.91,163.11) 1(208.91,164.52) 1(209.27,90.47) 1(209.27,90.82) 1(209.27,91.18) 1(209.27,91.88) 1(209.27,92.24) 1(209.27,163.46) 1(209.27,163.82) 1(209.27,164.17) 1(209.27,164.88) 1(209.27,165.23) 1(209.27,165.59) 1(209.27,165.94) 1(209.27,166.3) 1(209.98,87.63) 1(209.98,89.76) 1(209.98,166.65) 1(209.98,167) 1(209.98,167.36) 1(209.98,168.42) 1(210.33,87.28) 1(210.33,87.99) 1(210.33,88.34) 1(210.33,88.7) 1(210.33,89.05) 1(210.33,89.41) 1(210.33,90.11) 1(210.33,167.71) 1(210.33,168.07) 1(210.33,168.77) 1(210.33,169.13) 1(210.33,169.49) 1(210.33,169.84) 1(211.04,86.93) 1(211.39,84.09) 1(211.39,84.44) 1(211.39,84.8) 1(211.39,85.15) 1(211.39,85.51) 1(211.39,85.86) 1(211.39,86.22) 1(211.39,86.57) 1(211.39,170.19) 1(211.39,170.55) 1(211.39,170.9) 1(211.39,171.26) 1(211.39,171.61) 1(211.39,171.96) 1(211.39,172.32) 1(211.39,172.67) 1(211.75,83.74) 1(211.75,173.03) 1(212.1,173.38) 1(212.46,81.26) 1(212.46,81.61) 1(212.46,81.96) 1(212.46,82.32) 1(212.46,82.67) 1(212.46,83.03) 1(212.46,83.38) 1(212.46,173.74) 1(212.46,174.09) 1(212.46,174.44) 1(212.46,174.8) 1(212.46,175.15) 1(212.46,175.51) 1(212.81,80.55) 1(212.81,80.9) 1(213.52,78.42) 1(213.52,79.49) 1(213.52,80.19) 1(213.52,175.86) 1(213.52,176.22) 1(213.52,176.57) 1(213.52,176.93) 1(213.52,177.28) 1(213.52,177.63) 1(213.88,78.77) 1(213.88,79.13) 1(213.88,79.84) 1(213.88,177.99) 1(213.88,178.34) 1(213.88,178.7) 1(214.23,78.07) 1(214.58,75.94) 1(214.58,76.65) 1(214.58,77.36) 1(214.58,77.71) 1(214.58,179.05) 1(214.58,180.11) 1(214.94,76.3) 1(214.94,77) 1(214.94,179.41) 1(214.94,179.76) 1(214.94,180.47) 1(214.94,180.82) 1(214.94,181.18) 1(215.29,75.59) 1(215.65,75.23) 1(216,73.82) 1(216,74.17) 1(216,74.52) 1(216,74.88) 1(216,181.53) 1(216,181.88) 1(216,182.24) 1(216,182.6) 1(216,182.95) 1(216,183.3) 1(216.36,73.46) 1(216.71,72.4) 1(216.71,183.66) 1(217.06,71.33) 1(217.06,71.69) 1(217.06,72.04) 1(217.06,72.75) 1(217.06,73.11) 1(217.06,184.01) 1(217.06,184.37) 1(217.06,184.72) 1(217.06,185.07) 1(217.06,185.43) 1(217.42,185.78) 1(218.13,69.56) 1(218.13,69.92) 1(218.13,70.27) 1(218.13,70.63) 1(218.13,70.98) 1(218.13,186.14) 1(218.13,186.49) 1(218.13,186.85) 1(218.13,187.2) 1(218.48,68.85) 1(218.48,69.21) 1(218.48,187.55) 1(218.48,187.91) 1(219.19,67.08) 1(219.19,67.44) 1(219.19,188.26) 1(219.55,67.79) 1(219.55,68.15) 1(219.55,68.5) 1(219.55,188.62) 1(219.55,188.97) 1(219.9,66.73) 1(220.25,189.33) 1(220.25,190.04) 1(220.61,65.66) 1(220.61,66.02) 1(220.61,66.37) 1(220.61,189.68) 1(220.61,190.39) 1(220.61,190.74) 1(220.61,191.1) 1(220.61,191.45) 1(221.32,64.25) 1(221.32,64.6) 1(221.32,65.31) 1(221.32,192.16) 1(221.67,63.54) 1(221.67,63.89) 1(221.67,64.96) 1(221.67,191.81) 1(221.67,192.52) 1(221.67,192.87) 1(221.67,193.22) 1(221.67,193.58) 1(222.38,63.18) 1(222.73,62.12) 1(222.73,62.48) 1(222.73,62.83) 1(222.73,193.93) 1(222.73,194.29) 1(222.73,194.64) 1(223.8,59.99) 1(223.8,60.35) 1(223.8,60.71) 1(223.8,61.06) 1(223.8,61.41) 1(223.8,61.77) 1(223.8,194.99) 1(223.8,195.35) 1(223.8,195.71) 1(223.8,196.06) 1(223.8,196.41) 1(223.8,196.77) 1(223.8,197.12) 1(224.86,59.64) 1(224.86,197.48) 1(224.86,198.18) 1(225.21,58.93) 1(225.21,59.29) 1(225.21,197.83) 1(225.57,58.58) 1(225.92,57.16) 1(225.92,57.87) 1(225.92,58.22) 1(225.92,198.54) 1(225.92,199.25) 1(226.28,56.45) 1(226.28,56.81) 1(226.28,57.52) 1(226.28,198.89) 1(226.28,199.6) 1(226.28,199.96) 1(226.28,200.31) 1(226.63,200.66) 1(227.34,55.39) 1(227.34,55.74) 1(227.34,56.1) 1(227.34,201.02) 1(227.34,201.37) 1(227.34,201.73) 1(228.05,202.08) 1(228.4,54.33) 1(228.4,54.68) 1(228.4,55.04) 1(228.4,202.44) 1(228.4,202.79) 1(229.47,52.91) 1(229.47,53.26) 1(229.47,53.97) 1(229.47,203.15) 1(229.47,203.5) 1(229.47,203.85) 1(229.47,204.21) 1(229.82,52.2) 1(229.82,52.55) 1(229.82,53.62) 1(229.82,204.56) 1(229.82,204.92) 1(230.17,51.85) 1(230.53,51.14) 1(230.53,51.49) 1(230.53,205.27) 1(230.88,50.78) 1(230.88,205.63) 1(230.88,205.98) 1(231.24,206.33) 1(231.94,49.72) 1(231.94,50.07) 1(231.94,50.43) 1(231.94,206.69) 1(231.94,207.04) 1(231.94,207.4) 1(232.3,49.37) 1(233.01,48.66) 1(233.01,49.01) 1(233.01,207.75) 1(233.01,208.11) 1(233.01,208.46) 1(233.36,48.3) 1(234.07,47.24) 1(234.07,47.6) 1(234.07,47.95) 1(234.07,208.82) 1(234.07,209.17) 1(234.07,209.52) 1(235.13,46.88) 1(235.13,209.88) 1(235.13,210.59) 1(235.49,46.18) 1(235.49,46.53) 1(235.49,210.23) 1(236.2,44.76) 1(236.2,45.11) 1(236.2,45.47) 1(236.2,45.82) 1(236.2,210.94) 1(236.2,211.65) 1(236.55,43.7) 1(236.55,44.05) 1(236.55,44.41) 1(236.55,211.3) 1(236.55,212) 1(236.55,212.36) 1(236.55,212.71) 1(236.91,213.07) 1(237.26,43.34) 1(237.61,42.99) 1(237.61,213.42) 1(237.61,213.77) 1(237.61,214.13) 1(237.97,42.63) 1(238.32,42.28) 1(238.32,214.49) 1(238.68,41.93) 1(238.68,214.84) 1(238.68,215.19) 1(239.74,40.86) 1(239.74,41.22) 1(239.74,41.57) 1(239.74,215.55) 1(239.74,215.9) 1(239.74,216.26) 1(240.1,40.51) 1(240.8,39.8) 1(240.8,40.15) 1(240.8,216.61) 1(241.16,39.44) 1(241.16,216.96) 1(241.16,217.32) 1(241.16,217.67) 1(241.51,108.89) 1(241.51,109.96) 1(241.51,110.31) 1(241.51,147.52) 1(241.51,147.87) 1(241.87,39.09) 1(241.87,108.54) 1(241.87,109.25) 1(241.87,109.6) 1(241.87,110.66) 1(241.87,147.16) 1(241.87,148.22) 1(242.22,38.03) 1(242.22,38.38) 1(242.22,38.74) 1(242.22,108.18) 1(242.22,148.58) 1(242.22,148.93) 1(242.22,149.29) 1(242.22,218.03) 1(242.22,218.38) 1(242.58,107.48) 1(242.58,111.02) 1(242.58,149.64) 1(242.58,149.99) 1(242.58,218.74) 1(242.93,104.29) 1(242.93,104.64) 1(242.93,104.99) 1(242.93,105.35) 1(242.93,105.71) 1(242.93,106.06) 1(242.93,106.41) 1(242.93,106.77) 1(242.93,107.12) 1(242.93,107.83) 1(242.93,111.02) 1(242.93,147.16) 1(242.93,150.35) 1(242.93,150.71) 1(242.93,151.06) 1(242.93,151.41) 1(242.93,151.77) 1(242.93,152.12) 1(242.93,152.48) 1(242.93,152.83) 1(243.28,37.67) 1(243.28,103.93) 1(243.28,110.66) 1(243.28,147.16) 1(243.28,153.18) 1(243.64,37.32) 1(243.64,103.58) 1(243.64,110.66) 1(243.64,153.54) 1(243.64,153.89) 1(243.99,36.96) 1(243.99,100.39) 1(243.99,100.74) 1(243.99,101.1) 1(243.99,101.45) 1(243.99,101.81) 1(243.99,102.16) 1(243.99,102.52) 1(243.99,102.87) 1(243.99,103.22) 1(243.99,154.25) 1(243.99,154.6) 1(243.99,154.96) 1(243.99,155.31) 1(243.99,155.66) 1(243.99,156.02) 1(243.99,156.37) 1(244.35,219.09) 1(244.35,219.44) 1(244.35,219.8) 1(244.7,156.73) 1(244.7,157.08) 1(245.05,97.55) 1(245.05,97.91) 1(245.05,98.26) 1(245.05,98.62) 1(245.05,98.97) 1(245.05,99.33) 1(245.05,99.68) 1(245.05,100.04) 1(245.05,157.44) 1(245.05,157.79) 1(245.05,158.15) 1(245.05,158.5) 1(245.05,158.85) 1(245.05,159.21) 1(245.05,159.56) 1(245.05,159.92) 1(245.41,35.9) 1(245.41,36.26) 1(245.41,36.61) 1(245.41,97.2) 1(245.41,220.15) 1(245.41,220.51) 1(245.41,220.86) 1(245.77,160.27) 1(246.12,95.07) 1(246.12,95.43) 1(246.12,95.78) 1(246.12,96.14) 1(246.12,96.49) 1(246.12,160.63) 1(246.12,160.98) 1(246.12,161.33) 1(246.12,161.69) 1(246.12,162.04) 1(246.12,162.4) 1(246.12,162.75) 1(246.12,163.11) 1(246.47,34.84) 1(246.47,35.19) 1(246.47,35.55) 1(246.47,94.72) 1(246.47,96.85) 1(246.47,163.46) 1(246.47,221.22) 1(246.47,221.57) 1(246.47,221.93) 1(246.47,222.28) 1(246.83,94.72) 1(246.83,163.46) 1(246.83,222.28) 1(247.18,93.66) 1(247.18,94.01) 1(247.18,94.37) 1(247.18,94.72) 1(247.18,163.46) 1(247.54,34.49) 1(247.54,91.53) 1(247.54,91.88) 1(247.54,92.24) 1(247.54,92.6) 1(247.54,92.95) 1(247.54,93.3) 1(247.54,163.82) 1(247.54,164.17) 1(247.54,164.52) 1(247.54,164.88) 1(247.54,165.23) 1(247.54,165.59) 1(247.54,222.28) 1(247.54,222.63) 1(247.54,222.99) 1(247.89,33.77) 1(247.89,34.13) 1(247.89,223.34) 1(248.6,89.05) 1(248.6,89.41) 1(248.6,89.76) 1(248.6,90.11) 1(248.6,90.47) 1(248.6,90.82) 1(248.6,91.18) 1(248.6,165.94) 1(248.6,166.3) 1(248.6,166.65) 1(248.6,167) 1(248.6,167.36) 1(248.6,167.71) 1(248.95,32.71) 1(248.95,33.07) 1(248.95,33.42) 1(248.95,223.7) 1(248.95,224.05) 1(248.95,224.41) 1(249.31,32.36) 1(249.31,168.07) 1(249.66,32.36) 1(249.66,86.93) 1(249.66,87.28) 1(249.66,87.63) 1(249.66,87.99) 1(249.66,88.34) 1(249.66,88.7) 1(249.66,168.42) 1(249.66,168.77) 1(249.66,169.13) 1(249.66,169.49) 1(249.66,169.84) 1(250.02,31.65) 1(250.02,32) 1(250.02,32.36) 1(250.02,224.76) 1(250.02,225.11) 1(250.37,31.3) 1(250.37,170.19) 1(250.37,225.47) 1(250.72,85.86) 1(250.72,86.22) 1(250.72,86.57) 1(250.72,170.55) 1(250.72,170.9) 1(250.72,171.26) 1(250.72,171.96) 1(250.72,172.32) 1(251.08,171.61) 1(251.43,31.3) 1(251.43,85.51) 1(251.79,31.3) 1(251.79,83.74) 1(251.79,84.44) 1(251.79,84.8) 1(251.79,85.15) 1(251.79,172.67) 1(251.79,173.03) 1(251.79,173.38) 1(252.14,30.23) 1(252.14,30.94) 1(252.14,83.38) 1(252.14,84.09) 1(252.14,173.74) 1(252.14,225.82) 1(252.14,226.18) 1(252.14,226.53) 1(252.5,30.59) 1(252.85,83.03) 1(253.21,29.88) 1(253.21,81.26) 1(253.21,81.61) 1(253.21,81.96) 1(253.21,82.32) 1(253.21,82.67) 1(253.21,174.09) 1(253.21,174.44) 1(253.21,174.8) 1(253.21,175.15) 1(253.21,175.51) 1(253.21,175.86) 1(253.21,226.88) 1(253.56,29.17) 1(253.56,29.52) 1(253.56,227.24) 1(253.56,227.6) 1(253.56,227.95) 1(254.27,80.19) 1(254.27,80.55) 1(254.27,80.9) 1(254.27,176.22) 1(254.27,176.57) 1(254.27,176.93) 1(254.27,228.3) 1(254.62,28.11) 1(254.62,28.46) 1(254.62,28.82) 1(254.62,228.66) 1(254.98,79.84) 1(254.98,177.28) 1(254.98,229.01) 1(255.33,77.71) 1(255.33,78.07) 1(255.33,78.42) 1(255.33,78.77) 1(255.33,79.13) 1(255.33,79.49) 1(255.33,177.63) 1(255.33,177.99) 1(255.33,178.34) 1(255.33,178.7) 1(255.33,179.05) 1(255.69,27.75) 1(256.04,27.75) 1(256.04,179.41) 1(256.39,27.75) 1(256.39,77) 1(256.39,77.36) 1(256.39,179.76) 1(256.39,180.11) 1(256.75,27.04) 1(256.75,76.65) 1(256.75,229.37) 1(256.75,229.72) 1(256.75,230.07) 1(257.1,26.69) 1(257.1,27.4) 1(257.1,180.47) 1(257.46,76.3) 1(257.46,180.82) 1(257.46,181.18) 1(257.46,182.24) 1(257.81,26.33) 1(257.81,75.59) 1(257.81,75.94) 1(257.81,181.53) 1(257.81,181.88) 1(257.81,182.6) 1(257.81,230.43) 1(258.17,25.98) 1(258.17,230.78) 1(258.17,231.14) 1(258.52,25.63) 1(258.52,74.88) 1(258.52,75.23) 1(258.88,73.11) 1(258.88,73.46) 1(258.88,73.82) 1(258.88,74.17) 1(258.88,74.52) 1(258.88,182.95) 1(258.88,183.3) 1(258.88,183.66) 1(259.23,25.63) 1(259.58,25.63) 1(259.94,72.4) 1(259.94,72.75) 1(259.94,184.01) 1(259.94,184.37) 1(259.94,184.72) 1(259.94,231.49) 1(260.29,24.56) 1(260.29,24.92) 1(260.29,25.27) 1(260.29,72.04) 1(260.29,185.07) 1(260.29,231.85) 1(260.29,232.2) 1(260.65,185.07) 1(261,70.98) 1(261,71.33) 1(261,71.69) 1(261,185.07) 1(261,185.43) 1(261,185.78) 1(261,232.55) 1(261.36,23.85) 1(261.36,24.21) 1(261.36,232.91) 1(261.36,233.26) 1(261.71,186.14) 1(261.71,233.62) 1(262.06,23.5) 1(262.06,70.27) 1(262.06,70.63) 1(262.06,186.49) 1(262.06,186.85) 1(262.42,69.92) 1(262.42,187.2) 1(263.13,68.85) 1(263.13,69.56) 1(263.13,187.55) 1(263.13,188.26) 1(263.48,23.15) 1(263.48,69.21) 1(263.48,187.91) 1(263.48,233.97) 1(263.48,234.33) 1(263.83,22.44) 1(263.83,22.79) 1(263.83,68.5) 1(263.83,234.68) 1(264.19,68.5) 1(264.19,188.62) 1(264.55,67.44) 1(264.55,67.79) 1(264.55,68.15) 1(264.55,68.5) 1(264.55,188.97) 1(264.55,189.33) 1(264.55,235.04) 1(264.9,22.08) 1(264.9,189.68) 1(264.9,235.39) 1(265.25,22.08) 1(265.25,110.66) 1(265.25,235.74) 1(265.61,22.08) 1(265.61,66.37) 1(265.61,66.73) 1(265.61,67.08) 1(265.61,110.66) 1(265.61,190.04) 1(265.61,190.39) 1(265.96,21.02) 1(265.96,21.37) 1(265.96,21.73) 1(265.96,190.74) 1(266.67,65.31) 1(266.67,65.66) 1(266.67,66.02) 1(266.67,110.66) 1(266.67,191.1) 1(266.67,191.45) 1(266.67,191.81) 1(266.67,236.1) 1(267.02,20.66) 1(267.02,236.45) 1(267.02,236.81) 1(267.38,20.31) 1(267.38,110.66) 1(267.73,64.96) 1(267.73,110.66) 1(267.73,192.16) 1(267.73,192.52) 1(268.09,64.25) 1(268.09,64.6) 1(268.09,110.66) 1(268.09,192.87) 1(268.44,19.96) 1(268.44,237.16) 1(268.8,237.16) 1(269.15,62.83) 1(269.15,63.18) 1(269.15,63.54) 1(269.15,63.89) 1(269.15,193.22) 1(269.15,193.58) 1(269.15,193.93) 1(269.5,19.25) 1(269.5,19.6) 1(269.5,237.16) 1(269.5,237.52) 1(269.5,237.87) 1(269.86,18.89) 1(270.21,61.77) 1(270.21,62.12) 1(270.21,62.48) 1(270.21,194.29) 1(270.21,194.64) 1(270.21,194.99) 1(270.21,238.22) 1(270.92,110.66) 1(271.28,60.71) 1(271.28,61.06) 1(271.28,61.41) 1(271.28,110.66) 1(271.28,195.35) 1(271.28,195.71) 1(271.28,196.06) 1(271.28,238.22) 1(271.63,18.18) 1(271.63,18.54) 1(271.63,196.41) 1(271.63,238.22) 1(271.63,238.58) 1(271.99,17.83) 1(271.99,196.41) 1(271.99,238.93) 1(271.99,239.29) 1(272.34,110.66) 1(272.34,196.41) 1(272.34,196.77) 1(272.34,197.12) 1(272.69,197.48) 1(273.05,110.66) 1(273.4,59.99) 1(273.4,60.35) 1(273.76,17.12) 1(273.76,17.48) 1(273.76,59.64) 1(273.76,239.64) 1(274.11,239.99) 1(274.11,240.35) 1(274.47,16.77) 1(274.47,59.29) 1(274.47,197.83) 1(274.82,58.58) 1(274.82,58.93) 1(274.82,198.18) 1(274.82,198.54) 1(275.17,16.41) 1(275.53,16.41) 1(275.88,16.41) 1(275.88,57.16) 1(275.88,57.52) 